# Altium footprint library Custom_Library.PcbLib: 221 footprints (part 1 of 14)
Each footprint in its own frame and in the unit in brackets; x right, y up, seen from the top. Pads: shape width x height; smd on the part's side, far side on the other; paste and mask are expansions set on the pad; w line width, h text height; cw(c..) or ccw(c..) is an arc to the next point about the centre after c.
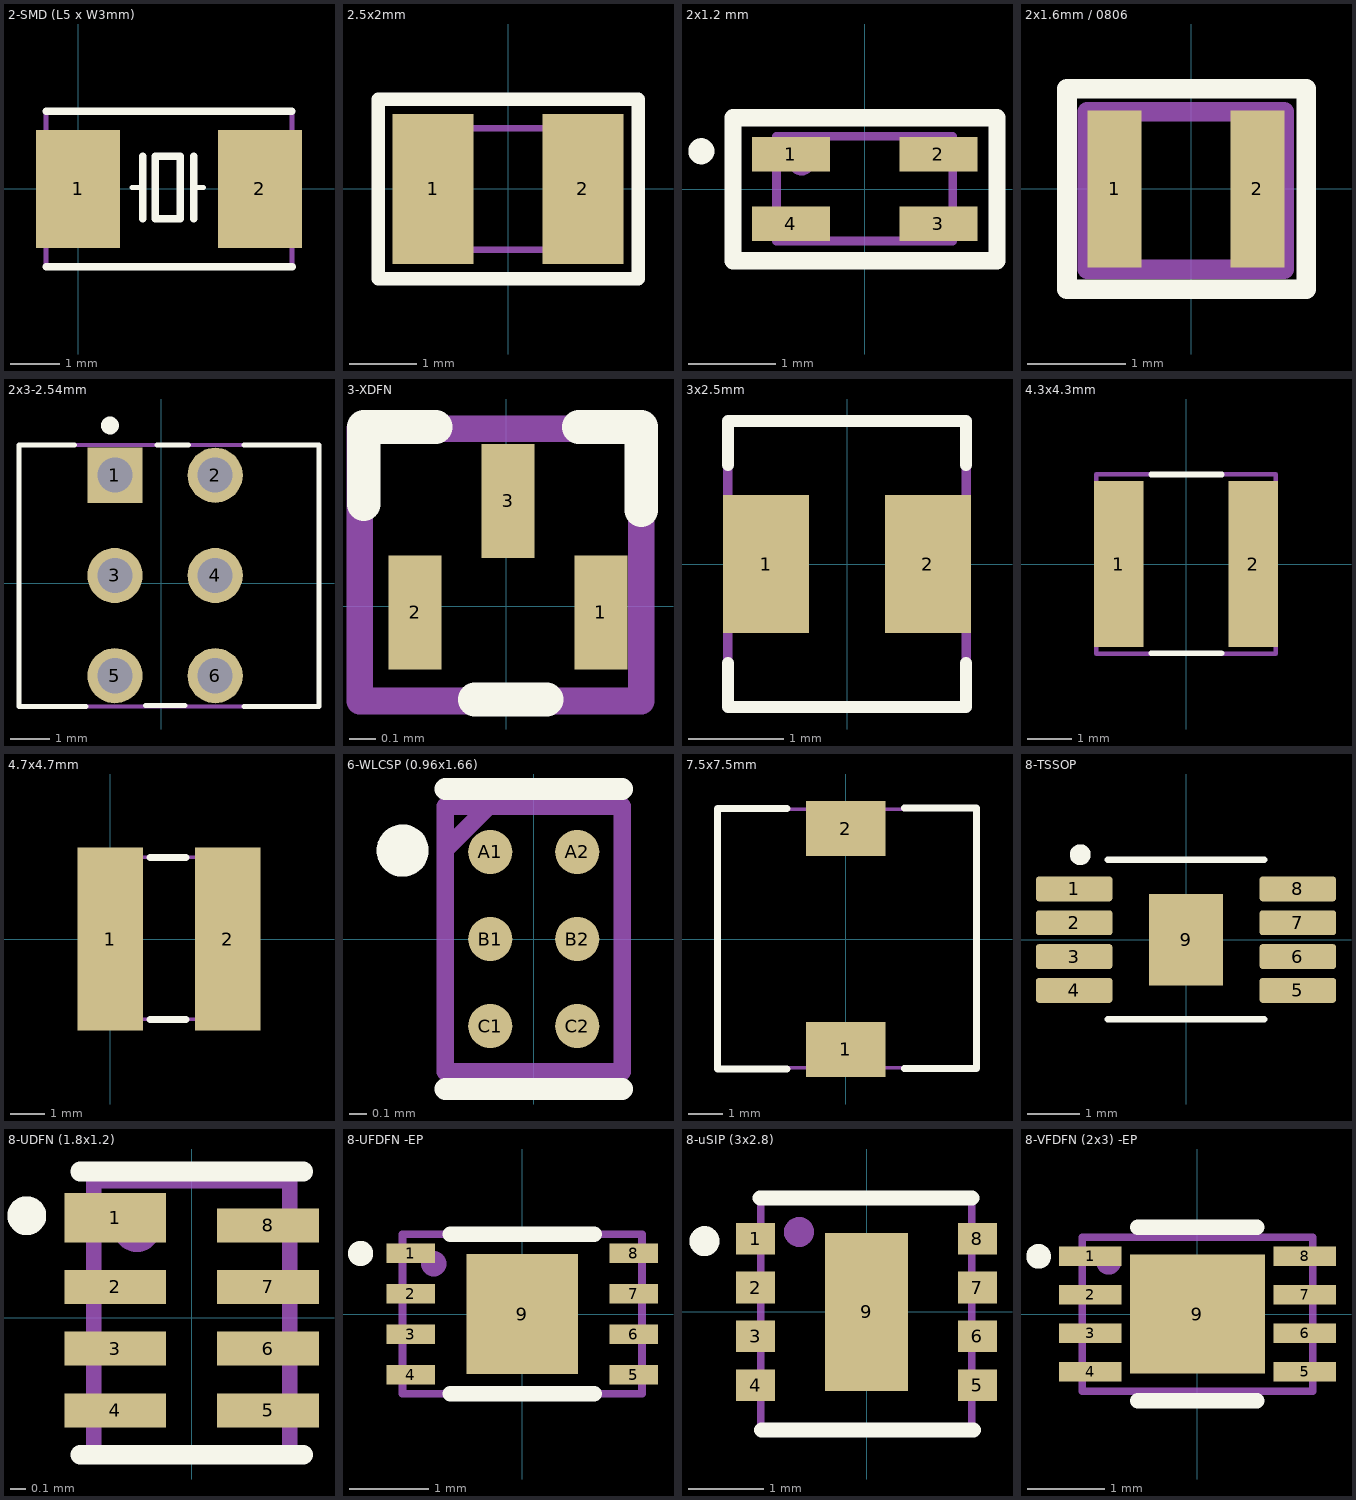
[diagram p0: the footprints below, top view; thin cyan lines are the x and y axes]

## 2-SMD (L5 x W3mm) [mm] "HC49UP"
pads (2):
  rect 1.7x2.4 smd: 1(0,0) 2(3.7,0)
Top Overlay:
  lines w0.1: 1.1,0.034 1.317,0.034 ; 2.35,0.034 2.55,0.034
  lines w0.15: -0.651,1.581 4.349,1.581 ; -0.647,-1.582 4.353,-1.582
  lines w0.152: 1.317,-0.601 1.317,0.034 1.317,0.669 ; 2.35,-0.601 2.35,0.034 2.35,0.669 ; 1.575,-0.601 1.575,0.669 2.083,0.669 2.083,-0.601 1.575,-0.601
Top Assembly:
  lines w0.1: -0.65,-1.6 -0.65,1.6 4.35,1.6 4.35,-1.6 -0.65,-1.6
  text "'.Designator'" at 2.169,-1.048 h2
3D body "Xtal_Smd_HCX-6FA.STEP": height 1.22, standoff -0.03, extent -0.65,-1.6 4.35,1.6

## 2.5x2mm [mm]
pads (2):
  rect 1.2x2.22 smd: 1(-1.11,0) 2(1.11,0)
Top Overlay:
  lines w0.2: -1.923,-1.331 -1.923,1.329 1.929,1.329 1.929,-1.331 -1.923,-1.331
Top Assembly:
  lines w0.1: -1.4,-0.9 -1.4,0.9 -1,0.9 1.354,0.9 1.354,-0.9 -1.4,-0.9
  text "'.Designator'" at -3.454,-2.385 h1.27
3D body: height 1, standoff 0, extent -1.4,-0.9 1.354,0.9

## 2x1.2 mm [mm]
pads (4):
  rect 0.9x0.4 smd: 1(-0.85,0.4) 2(0.85,0.4) 3(0.85,-0.4) 4(-0.85,-0.4)
Top Overlay:
  circle w0.2: c-1.882,0.435 r0.05
  lines w0.2: -1.517,-0.825 1.526,-0.825 1.526,0.82 -1.517,0.82 -1.517,-0.825
Top Assembly:
  circle w0.2: c-0.727,0.307 r0.05
  lines w0.1: -1.016,-0.599 1.014,-0.599 1.014,0.607 -1.016,0.607 -1.016,-0.599
3D body "744231061_Download_STP_WE-CNSW-0805_rev1.stp": height -0.39, standoff -1.59, extent -1,-0.6 1,0.6

## 2x1.6mm / 0806 [mm]
pads (2):
  rect 0.55x1.6 smd: 1(-0.779,-0.003) 2(0.671,-0.003)
Top Overlay:
  lines w0.2: -1.263,-1.022 -1.263,1.015 1.169,1.015 1.169,-1.022 -1.263,-1.022
Top Assembly:
  lines w0.2: -1.057,-0.819 -1.057,0.781 0.943,0.781 0.943,-0.819 -1.057,-0.819
  text "'.Designator'" at -3.196,-2.272 h1.27
3D body: height 1, standoff 0, extent -1.057,-0.819 0.943,0.781

## 2x3-2.54mm [mil]
pads (6):
  rect 55x55 hole 35: 1(-46.06,107.87)
  round 55 hole 35: 2(53.94,107.87) 3(-46.06,7.87) 4(53.94,7.87) 5(-46.06,-92.13) 6(53.94,-92.13)
Top Overlay:
  circle w9.84: c-50.98,157.46 r4
  lines w5: -86.61,137.8 -141.73,137.8 -141.73,-122.78 -74.8,-122.78 ; -15.75,-122.05 23.62,-122.05 ; -3.94,137.8 27.56,137.8 ; 82.68,-122.78 157.48,-122.78 157.48,137.8 82.68,137.8
Top Assembly:
  lines w3.94: 157.43,-122.87 157.43,-80.74 157.43,19.26 157.43,137.63 ; 157.43,137.76 -141.64,137.76 -141.64,-89.64 -141.64,-122.87 157.48,-122.87
  text "'.Designator'" at -120.88,-174.13 h50
3D body "76385-303LFc.STEP": height 348.03, standoff -154.72, extent -139.86,-122.44 158.66,138.19

## 3-XDFN [mm]
pads (3):
  rect 0.2x0.43 smd: 1(0.357,-0.023) 3(0.007,0.397)
  rect 0.2x0.43 smd mask+0.1: 2(-0.343,-0.023)
Top Overlay:
  lines w0.127: -0.536,0.385 -0.536,0.676 -0.266,0.676 ; -0.119,-0.351 0.152,-0.351 ; 0.274,0.676 0.509,0.676 0.509,0.362
Top Assembly:
  lines w0.1: -0.552,-0.356 -0.552,0.67 0.509,0.67 0.509,-0.356 -0.552,-0.356
  text "'.Designator'" at -3.3,-1.5 h1.27
3D body: height 0.43, standoff 0.02, extent -0.55,-0.35 0.55,0.71

## 3x2.5mm [mm]
pads (2):
  rect 0.9x1.45 smd: 1(-0.85,0) 2(0.85,0)
Top Overlay:
  lines w0.127: -1.25,-1.04 -1.25,-1.5 1.25,-1.5 1.25,-1.04 ; -1.25,1.04 -1.25,1.5 1.25,1.5 1.25,1.04
Top Assembly:
  lines w0.1: -1.25,-1.5 -1.25,1.05 -1.25,1.5 1.25,1.5 1.25,-1.5 -1.25,-1.5
  text "'.Designator'" at -2.74,-2.62 h1.27
3D body: height 1.5, standoff 0, extent -1.25,-1.5 1.25,1.5

## 4.3x4.3mm [mm]
pads (2):
  rect 1.1x3.7 smd mask+0.05: 1(-1.5,0) 2(1.5,0)
Top Overlay:
  lines w0.127: -0.779,-1.993 0.795,-1.993 ; -0.776,2 0.798,2
Top Assembly:
  lines w0.1: -2,-2 -1.75,-2 1.75,-2 2,-2 2,2 1.75,2 -2,2 -2,1.35 -2,-2
  text "'.Designator'" at -3.048,-3.175 h1.27
3D body "ASPI-4020S.STEP": height 2, standoff 0, extent -2,-2 2,2

## 4.7x4.7mm [mm]
pads (2):
  rect 1.9x5.3 smd mask+0.05: 1(0,0) 2(3.4,0)
Top Overlay:
  lines w0.2: 1.154,-2.332 2.192,-2.332 ; 1.154,2.368 2.192,2.368
Top Assembly:
  lines w0.1: -0.766,-2.329 -0.766,2.371 -0.566,2.371 4.134,2.371 4.134,-2.329 3.934,-2.329 -0.766,-2.329
  text "'.Designator'" at -1.496,-3.942 h1.27
3D body: height 2.4, standoff 0, extent -0.6,-2.336 4,2.4

## 6-WLCSP (0.96x1.66) [mil]
pads (6):
  round 10 smd: A1(-9.84,19.68) A2(9.84,19.68) B1(-9.84,0) B2(9.84,0) C1(-9.84,-19.68) C2(9.84,-19.68)
Top Overlay:
  circle w7.87: c-29.67,20 r1.97
  lines w5: -20,-33.94 0,-33.94 20,-33.94 ; -20,33.94 20,33.94
Top Assembly:
  lines w3.94: -20,20.16 -10.16,30 ; -20,-30 -20,30 20,30 20,-30 -20,-30
  text "'.Designator'" at -118.38,-76.54 h50
3D body: height 10, standoff 0, extent 0,0 10,10
3D body "WLCSP-6B_ONS.step": height 25.12, standoff 0, extent -20,-30 20,30

## 7.5x7.5mm [mm]
pads (2):
  rect 2.3x1.6 smd: 1(0,-3.2) 2(0,3.2)
Top Overlay:
  lines w0.2: -1.704,-3.768 -3.712,-3.768 -3.712,3.789 -1.704,3.789 ; 1.7,-3.757 3.8,-3.757 3.8,3.8 1.7,3.8
Top Assembly:
  lines w0.1: -3.72,-3.734 3.78,-3.734 3.78,3.766 -3.72,3.766 -3.72,-3.734
  text "'.Designator'" at -3.173,-0.442 h1.27
3D body: height 4.55, standoff 0, extent -3.72,-3.734 3.78,3.766

## 8-TSSOP [mm]
pads (9):
  rrect25% 1.47x0.48 smd: 1(-2.15,0.975) 2(-2.15,0.325) 3(-2.15,-0.325) 4(-2.15,-0.975) 5(2.15,-0.975) 6(2.15,-0.325) 7(2.15,0.325) 8(2.15,0.975)
  rect 1.425x1.76 smd paste-2: 9(0,0)
Top Overlay:
  circle w0.2: c-2.034,1.634 r0.1
  lines w0.127: -1.5,-1.535 1.5,-1.535 ; -1.5,1.535 1.5,1.535
Top Paste:
  region: 0.356,-0.44 -0.356,-0.44 -0.356,0.44 0.356,0.44

## 8-UDFN (1.8x1.2) [mm]
pads (8):
  rect 0.66x0.32 smd paste+0 mask+0.076: 1(-0.495,0.65)
  rect 0.66x0.22 smd paste+0 mask+0.076: 2(-0.495,0.2) 3(-0.495,-0.2) 4(-0.495,-0.6) 5(0.495,-0.6) 6(0.495,-0.2) 7(0.495,0.2) 8(0.495,0.6)
Top Overlay:
  circle w0.15: c-1.069,0.662 r0.051
  lines w0.127: -0.724,-0.889 0.724,-0.889 ; -0.724,0.949 0.724,0.949
Top Assembly:
  circle w0.2: c-0.356,0.577 r0.051
  lines w0.1: -0.635,-0.889 0.635,-0.889 0.635,0.889 -0.635,0.889 -0.635,-0.889
  text "'.Designator'" at -3.302,-2.159 h1.27
3D body "UDFN8_1P20X1P80_ONS.step": height 0.56, standoff 0, extent -0.597,-0.902 0.597,0.902

## 8-UFDFN -EP [mil]
pads (9):
  rect 24x9.84 smd paste+0 mask+2: 1(-55.06,30) 2(-55.06,10) 3(-55.06,-10) 4(-55.06,-30) 5(55.06,-30) 6(55.06,-10) 7(55.06,10) 8(55.06,30)
  rect 55x59 smd mask+2: 9(0,0)
Top Overlay:
  circle w10: c-79.8,29.89 r1.24
  lines w7.87: -35.43,-39.37 35.43,-39.37 ; -35.43,39.37 35.43,39.37
Top Assembly:
  circle w10: c-43.64,24.82 r1.24
  lines w3.94: -59.06,-39.37 -59.06,39.37 59.06,39.37 59.06,-39.37 -59.06,-39.37
  text "'.Designator'" at -118.21,-83 h50
3D body: height 10, standoff 0, extent 0,0 10,10
3D body "VSON008X2030_ROM.step": height 24.09, standoff 0, extent -59.01,-39.49 59.01,39.49

## 8-uSIP (3x2.8) [mm]
pads (9):
  rect 0.52x0.42 smd mask+0.102: 1(-1.475,0.975) 2(-1.475,0.325) 3(-1.475,-0.325) 4(-1.475,-0.975) 5(1.475,-0.975) 6(1.475,-0.325) 7(1.475,0.325) 8(1.475,0.975)
  rect 1.1x2.1 smd mask+0.102: 9(0,0)
Top Overlay:
  circle w0.2: c-2.155,0.942 r0.1
  lines w0.2: -1.417,1.516 -1.046,1.516 1.402,1.516 ; -1.398,-1.569 1.42,-1.569
Top Assembly:
  circle w0.2: c-0.899,1.064 r0.1
  lines w0.1: -1.408,-1.57 1.398,-1.57 1.398,1.488 -1.408,1.488 -1.408,1.285 -1.408,-1.57
  text "'.Designator'" at -3.014,-2.78 h1.27
3D body "step_temp.STEP": height 1.53, standoff 0, extent -1.402,-1.498 1.398,1.502

## 8-VFDFN (2x3) -EP [mil]
pads (9):
  rect 32x10 smd mask+2: 1(-55,29.53) 2(-55,9.84) 3(-55,-9.84) 4(-55,-29.53) 5(55,-29.53) 6(55,-9.84) 7(55,9.84) 8(55,29.53)
  rect 69x61 smd mask+2: 9(0,0)
Top Overlay:
  circle w10: c-81.42,29.5 r1.3
  lines w7.87: -30.51,-44.5 30.51,-44.5 ; -30.51,44.5 30.51,44.5
Top Assembly:
  circle w10: c-45.42,26.52 r1.3
  lines w3.94: -59.06,-39.51 59.07,-39.51 59.07,39.37 -59.06,39.37 -59.06,-39.51
  text "'.Designator'" at -133.96,-83 h50
3D body: height 10, standoff 0, extent 0,0 10,10
3D body "DFN8_2x3MC_MCH.step": height 37.09, standoff 0, extent -59.01,-39.49 59.01,39.49